# Altium footprint library 6-Connectors-2.PcbLib: 57 footprints (part 4 of 7)
Each footprint in its own frame and in the unit in brackets; x right, y up, seen from the top. Pads: shape width x height; smd on the part's side, far side on the other; paste and mask are expansions set on the pad; w line width, h text height; cw(c..) or ccw(c..) is an arc to the next point about the centre after c.
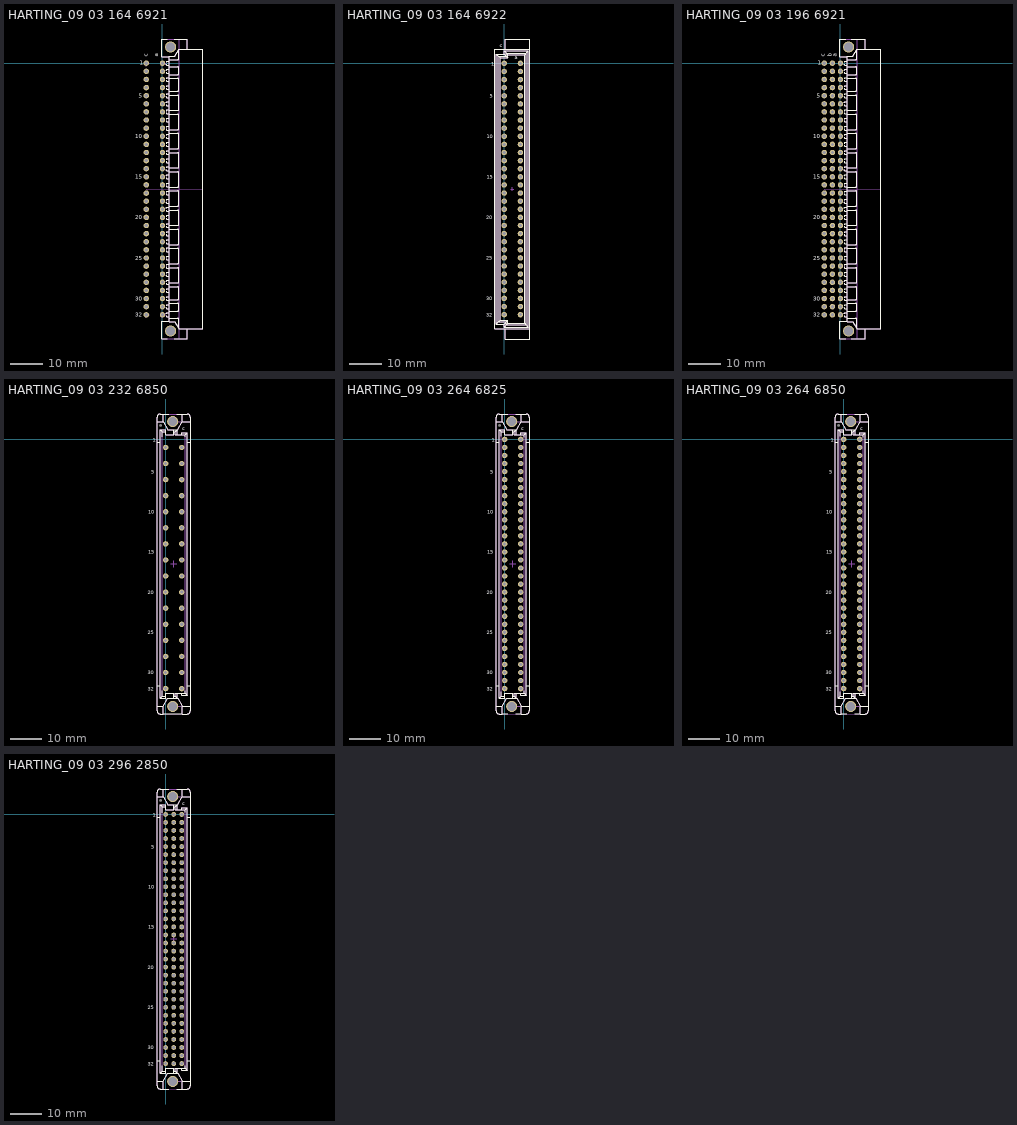
[diagram p3: the footprints below, top view; thin cyan lines are the x and y axes]

## HARTING_09 03 164 6921 [mm] "Connector; DIN 41612, Type C, Thru-Hole; Rows a+c, 64 Position; Right Angle"
height 9.35
pads (66):
  round 1.7 hole 1: a1(0,0) a2(0,-2.54) a3(0,-5.08) a4(0,-7.62) a5(0,-10.16) a6(0,-12.7) a7(0,-15.24) a8(0,-17.78) a9(0,-20.32) a10(0,-22.86) a11(0,-25.4) a12(0,-27.94) a13(0,-30.48) a14(0,-33.02) a15(0,-35.56) a16(0,-38.1) a17(0,-40.64) a18(0,-43.18) a19(0,-45.72) a20(0,-48.26) a21(0,-50.8) a22(0,-53.34) a23(0,-55.88) a24(0,-58.42) a25(0,-60.96) a26(0,-63.5) a27(0,-66.04) a28(0,-68.58) a29(0,-71.12) a30(0,-73.66) a31(0,-76.2) a32(0,-78.74) c1(-5.08,0) c2(-5.08,-2.54) c3(-5.08,-5.08) c4(-5.08,-7.62) c5(-5.08,-10.16) c6(-5.08,-12.7) c7(-5.08,-15.24) c8(-5.08,-17.78) c9(-5.08,-20.32) c10(-5.08,-22.86) c11(-5.08,-25.4) c12(-5.08,-27.94) c13(-5.08,-30.48) c14(-5.08,-33.02) c15(-5.08,-35.56) c16(-5.08,-38.1) c17(-5.08,-40.64) c18(-5.08,-43.18) c19(-5.08,-45.72) c20(-5.08,-48.26) c21(-5.08,-50.8) c22(-5.08,-53.34) c23(-5.08,-55.88) c24(-5.08,-58.42) c25(-5.08,-60.96) c26(-5.08,-63.5) c27(-5.08,-66.04) c28(-5.08,-68.58) c29(-5.08,-71.12) c30(-5.08,-73.66) c31(-5.08,-76.2) c32(-5.08,-78.74)
  round 3.5 / inner round 3.5 / far side round 5.1 hole 2.8: MTG1(2.54,5.08) MTG2(2.54,-83.82)
Top Overlay:
  drawing of 224 lines, arcs and shapes, not listed
  text "1" at -7.045,-0.55 h1.2
  text "c" at -4.58,2.04 h1.2
  text "a" at -1.325,2.09 h1.2
  text "32" at -8.57,-79.39 h1.2
  text "5" at -7.445,-10.86 h1.2
  text "10" at -8.495,-23.51 h1.2
  text "15" at -8.47,-36.11 h1.2
  text "20" at -8.57,-48.91 h1.2
  text "25" at -8.57,-61.61 h1.2
  text "30" at -8.57,-74.31 h1.2
Mechanical 8:
  lines w0.1: -5.08,-79.74 -5.08,-78.74 -4.08,-78.74 ; -5.08,-39.37 12.64,-39.37 ; -5.08,-1 -5.08,0 -4.08,0 ; 0,-79.74 0,-78.74 1,-78.74 ; 0,-1 0,0 1,0 ; 2.54,-84.82 2.54,-83.82 3.54,-83.82 ; 2.54,4.08 2.54,5.08 3.54,5.08 ; 5.3,-86.32 5.3,7.58
  text "PCB" at 5.08,-41.275 h1.2
Mechanical 14:
  drawing of 222 lines, arcs and shapes, not listed
  text "1" at -7.045,-0.55 h1.2
  text "c" at -4.58,2.04 h1.2
  text "a" at -1.325,2.09 h1.2
  text "32" at -8.57,-79.39 h1.2
  text "5" at -7.445,-10.86 h1.2
  text "10" at -8.495,-23.51 h1.2
  text "15" at -8.47,-36.11 h1.2
  text "20" at -8.57,-48.91 h1.2
  text "25" at -8.57,-61.61 h1.2
  text "30" at -8.57,-74.31 h1.2
3D body "HARTING_09 03 164 6921.stp": height 9.4, standoff -3, extent -5.38,-86.37 12.64,7.63
3D body "v160-080.stp": height 0.02, standoff -1.65, extent -5.88,-0.8 -4.28,0.8
3D body "v160-080.stp": height 0.02, standoff -1.65, extent -5.88,-5.88 -4.28,-4.28
3D body "v160-080.stp": height 0.02, standoff -1.65, extent -5.88,-3.34 -4.28,-1.74
3D body "v160-080.stp": height 0.02, standoff -1.65, extent -0.8,-0.8 0.8,0.8
3D body "v160-080.stp": height 0.02, standoff -1.65, extent -0.8,-5.88 0.8,-4.28
3D body "v160-080.stp": height 0.02, standoff -1.65, extent -0.8,-3.34 0.8,-1.74
3D body "v160-080.stp": height 0.02, standoff -1.65, extent -5.88,-8.42 -4.28,-6.82
3D body "v160-080.stp": height 0.02, standoff -1.65, extent -5.88,-13.5 -4.28,-11.9
3D body "v160-080.stp": height 0.02, standoff -1.65, extent -5.88,-10.96 -4.28,-9.36
3D body "v160-080.stp": height 0.02, standoff -1.65, extent -0.8,-8.42 0.8,-6.82
3D body "v160-080.stp": height 0.02, standoff -1.65, extent -0.8,-13.5 0.8,-11.9
3D body "v160-080.stp": height 0.02, standoff -1.65, extent -0.8,-10.96 0.8,-9.36
3D body "v160-080.stp": height 0.02, standoff -1.65, extent -0.8,-16.04 0.8,-14.44
3D body "v160-080.stp": height 0.02, standoff -1.65, extent -0.8,-21.12 0.8,-19.52
3D body "v160-080.stp": height 0.02, standoff -1.65, extent -0.8,-18.58 0.8,-16.98
3D body "v160-080.stp": height 0.02, standoff -1.65, extent -5.88,-16.04 -4.28,-14.44
3D body "v160-080.stp": height 0.02, standoff -1.65, extent -5.88,-21.12 -4.28,-19.52
3D body "v160-080.stp": height 0.02, standoff -1.65, extent -5.88,-18.58 -4.28,-16.98
3D body "v160-080.stp": height 0.02, standoff -1.65, extent -0.8,-23.66 0.8,-22.06
3D body "v160-080.stp": height 0.02, standoff -1.65, extent -0.8,-28.74 0.8,-27.14
3D body "v160-080.stp": height 0.02, standoff -1.65, extent -0.8,-26.2 0.8,-24.6
3D body "v160-080.stp": height 0.02, standoff -1.65, extent -5.88,-23.66 -4.28,-22.06
3D body "v160-080.stp": height 0.02, standoff -1.65, extent -5.88,-28.74 -4.28,-27.14
3D body "v160-080.stp": height 0.02, standoff -1.65, extent -5.88,-26.2 -4.28,-24.6
3D body "v160-080.stp": height 0.02, standoff -1.65, extent -0.8,-31.28 0.8,-29.68
3D body "v160-080.stp": height 0.02, standoff -1.65, extent -0.8,-36.36 0.8,-34.76
3D body "v160-080.stp": height 0.02, standoff -1.65, extent -0.8,-33.82 0.8,-32.22
3D body "v160-080.stp": height 0.02, standoff -1.65, extent -5.88,-31.28 -4.28,-29.68
3D body "v160-080.stp": height 0.02, standoff -1.65, extent -5.88,-36.36 -4.28,-34.76
3D body "v160-080.stp": height 0.02, standoff -1.65, extent -5.88,-33.82 -4.28,-32.22
3D body "v160-080.stp": height 0.02, standoff -1.65, extent -0.8,-38.9 0.8,-37.3
3D body "v160-080.stp": height 0.02, standoff -1.65, extent -0.8,-43.98 0.8,-42.38
3D body "v160-080.stp": height 0.02, standoff -1.65, extent -0.8,-41.44 0.8,-39.84
3D body "v160-080.stp": height 0.02, standoff -1.65, extent -5.88,-38.9 -4.28,-37.3
3D body "v160-080.stp": height 0.02, standoff -1.65, extent -5.88,-43.98 -4.28,-42.38
3D body "v160-080.stp": height 0.02, standoff -1.65, extent -5.88,-41.44 -4.28,-39.84
3D body "v160-080.stp": height 0.02, standoff -1.65, extent -0.8,-46.52 0.8,-44.92
3D body "v160-080.stp": height 0.02, standoff -1.65, extent -0.8,-51.6 0.8,-50
3D body "v160-080.stp": height 0.02, standoff -1.65, extent -0.8,-49.06 0.8,-47.46
3D body "v160-080.stp": height 0.02, standoff -1.65, extent -5.88,-46.52 -4.28,-44.92
3D body "v160-080.stp": height 0.02, standoff -1.65, extent -5.88,-51.6 -4.28,-50
3D body "v160-080.stp": height 0.02, standoff -1.65, extent -5.88,-49.06 -4.28,-47.46
3D body "v160-080.stp": height 0.02, standoff -1.65, extent -0.8,-54.14 0.8,-52.54
3D body "v160-080.stp": height 0.02, standoff -1.65, extent -0.8,-59.22 0.8,-57.62
3D body "v160-080.stp": height 0.02, standoff -1.65, extent -0.8,-56.68 0.8,-55.08
3D body "v160-080.stp": height 0.02, standoff -1.65, extent -5.88,-54.14 -4.28,-52.54
3D body "v160-080.stp": height 0.02, standoff -1.65, extent -5.88,-59.22 -4.28,-57.62
3D body "v160-080.stp": height 0.02, standoff -1.65, extent -5.88,-56.68 -4.28,-55.08
3D body "v160-080.stp": height 0.02, standoff -1.65, extent -0.8,-61.76 0.8,-60.16
3D body "v160-080.stp": height 0.02, standoff -1.65, extent -0.8,-66.84 0.8,-65.24
3D body "v160-080.stp": height 0.02, standoff -1.65, extent -0.8,-64.3 0.8,-62.7
3D body "v160-080.stp": height 0.02, standoff -1.65, extent -5.88,-61.76 -4.28,-60.16
3D body "v160-080.stp": height 0.02, standoff -1.65, extent -5.88,-66.84 -4.28,-65.24
3D body "v160-080.stp": height 0.02, standoff -1.65, extent -5.88,-64.3 -4.28,-62.7
3D body "v160-080.stp": height 0.02, standoff -1.65, extent -0.8,-69.38 0.8,-67.78
3D body "v160-080.stp": height 0.02, standoff -1.65, extent -0.8,-74.46 0.8,-72.86
3D body "v160-080.stp": height 0.02, standoff -1.65, extent -0.8,-71.92 0.8,-70.32
3D body "v160-080.stp": height 0.02, standoff -1.65, extent -5.88,-69.38 -4.28,-67.78
3D body "v160-080.stp": height 0.02, standoff -1.65, extent -5.88,-74.46 -4.28,-72.86
3D body "v160-080.stp": height 0.02, standoff -1.65, extent -5.88,-71.92 -4.28,-70.32
3D body "v160-080.stp": height 0.02, standoff -1.65, extent -0.8,-77 0.8,-75.4
3D body "v160-080.stp": height 0.02, standoff -1.65, extent -0.8,-79.54 0.8,-77.94
3D body "v160-080.stp": height 0.02, standoff -1.65, extent -5.88,-77 -4.28,-75.4
3D body "v160-080.stp": height 0.02, standoff -1.65, extent -5.88,-79.54 -4.28,-77.94

## HARTING_09 03 164 6922 [mm] "DIN 41612, Type C,  Thru-Hole; Rows a+c, 64 Position, Performance level 2, Lead 3mm, Pitch 2.54mm, Straight Male Connector"
height 13
pads (64):
  round 1.7 hole 1: a1(5.08,0) a2(5.08,-2.54) a3(5.08,-5.08) a4(5.08,-7.62) a5(5.08,-10.16) a6(5.08,-12.7) a7(5.08,-15.24) a8(5.08,-17.78) a9(5.08,-20.32) a10(5.08,-22.86) a11(5.08,-25.4) a12(5.08,-27.94) a13(5.08,-30.48) a14(5.08,-33.02) a15(5.08,-35.56) a16(5.08,-38.1) a17(5.08,-40.64) a18(5.08,-43.18) a19(5.08,-45.72) a20(5.08,-48.26) a21(5.08,-50.8) a22(5.08,-53.34) a23(5.08,-55.88) a24(5.08,-58.42) a25(5.08,-60.96) a26(5.08,-63.5) a27(5.08,-66.04) a28(5.08,-68.58) a29(5.08,-71.12) a30(5.08,-73.66) a31(5.08,-76.2) a32(5.08,-78.74) c1(0,0) c2(0,-2.54) c3(0,-5.08) c4(0,-7.62) c5(0,-10.16) c6(0,-12.7) c7(0,-15.24) c8(0,-17.78) c9(0,-20.32) c10(0,-22.86) c11(0,-25.4) c12(0,-27.94) c13(0,-30.48) c14(0,-33.02) c15(0,-35.56) c16(0,-38.1) c17(0,-40.64) c18(0,-43.18) c19(0,-45.72) c20(0,-48.26) c21(0,-50.8) c22(0,-53.34) c23(0,-55.88) c24(0,-58.42) c25(0,-60.96) c26(0,-63.5) c27(0,-66.04) c28(0,-68.58) c29(0,-71.12) c30(0,-73.66) c31(0,-76.2) c32(0,-78.74)
Top Overlay:
  lines w0.2: 0.39,-83.121 0.39,-86.37 8.04,-86.37 8.04,7.63 0.39,7.63 0.39,4.38 ; 8.04,-83.12 -2.96,-83.12 -2.96,4.38 8.04,4.38 ; -2.46,-81.67 -2.46,2.93 ; -2.46,-81.67 -0.06,-81.67 ; -2.46,-81.67 -1.81,-81.02 ; -2.46,2.93 -0.06,2.93 ; -2.46,2.93 -1.31,1.78 ; -1.81,-81.02 -1.81,2.28 0.59,2.28 0.59,3.23 6.89,3.23 6.89,-81.97 0.59,-81.97 0.59,-81.02 -1.81,-81.02 ; -1.81,-81.02 -1.31,-80.52 ; -1.31,-80.52 -1.31,1.78 ; -1.31,-80.52 1.09,-80.52 ; -1.31,1.78 1.09,1.78 ; -0.06,-82.62 -0.06,-81.67 ; -0.06,-82.62 7.54,-82.62 ; -0.06,-82.62 1.09,-81.47 ; -0.06,-81.67 1.09,-80.52 ; -0.06,2.93 -0.06,3.88 ; -0.06,2.93 1.09,1.78 ; -0.06,3.88 7.54,3.88 ; -0.06,3.88 1.09,2.73 ; 1.09,-81.47 1.09,-80.52 ; 1.09,-81.47 6.39,-81.47 ; 1.09,1.78 1.09,2.73 ; 1.09,2.73 6.39,2.73 ; 6.39,-81.47 6.39,2.73 ; 6.39,-81.47 7.54,-82.62 ; 6.39,2.73 7.54,3.88 ; 7.54,-82.62 7.54,3.88
  text "10" at -5.475,-23.46 h1.2
  text "c" at -1.445,5.06 h1.2
  text "a" at 3.249,1.235 h1.2
  text "32" at -5.675,-79.365 h1.2
  text "5" at -4.55,-10.835 h1.2
  text "30" at -5.675,-74.285 h1.2
  text "25" at -5.675,-61.585 h1.2
  text "20" at -5.675,-48.885 h1.2
  text "15" at -5.475,-36.135 h1.2
  text "1" at -4.075,-0.675 h1.2
Mechanical 8:
  drawing of 260 lines, arcs and shapes, not listed
Mechanical 14:
  lines w0.1: 0.39,-83.121 0.39,-86.37 8.04,-86.37 8.04,7.63 0.39,7.63 0.39,4.38 ; 8.04,-83.12 -2.96,-83.12 -2.96,4.38 8.04,4.38 ; -2.46,-81.67 -2.46,2.93 ; -2.46,-81.67 -0.06,-81.67 ; -2.46,-81.67 -1.81,-81.02 ; -2.46,2.93 -0.06,2.93 ; -2.46,2.93 -1.31,1.78 ; -1.81,-81.02 -1.81,2.28 0.59,2.28 0.59,3.23 6.89,3.23 6.89,-81.97 0.59,-81.97 0.59,-81.02 -1.81,-81.02 ; -1.81,-81.02 -1.31,-80.52 ; -1.31,-80.52 -1.31,1.78 ; -1.31,-80.52 1.09,-80.52 ; -1.31,1.78 1.09,1.78 ; -0.06,-82.62 -0.06,-81.67 ; -0.06,-82.62 7.54,-82.62 ; -0.06,-82.62 1.09,-81.47 ; -0.06,-81.67 1.09,-80.52 ; -0.06,2.93 -0.06,3.88 ; -0.06,2.93 1.09,1.78 ; -0.06,3.88 7.54,3.88 ; -0.06,3.88 1.09,2.73 ; 1.09,-81.47 1.09,-80.52 ; 1.09,-81.47 6.39,-81.47 ; 1.09,1.78 1.09,2.73 ; 1.09,2.73 6.39,2.73 ; 6.39,-81.47 6.39,2.73 ; 6.39,-81.47 7.54,-82.62 ; 6.39,2.73 7.54,3.88 ; 7.54,-82.62 7.54,3.88
  text "10" at -5.475,-23.46 h1.2
  text "32" at -5.675,-79.365 h1.2
  text "5" at -4.55,-10.835 h1.2
  text "30" at -5.675,-74.285 h1.2
  text "25" at -5.675,-61.585 h1.2
  text "20" at -5.675,-48.885 h1.2
  text "15" at -5.475,-36.135 h1.2
  text "1" at -4.075,-0.675 h1.2
  text "a" at 3.249,1.235 h1.2
  text "c" at -1.445,5.06 h1.2
3D body "HARTING_09 03 164 6922.stp": height 13, standoff -3, extent -2.96,-86.37 8.04,7.63

## HARTING_09 03 196 6921 [mm] "Connector; DIN 41612, Type C, Thru-Hole; Rows a+b+c, 96 Position; Right Angle"
height 11
pads (98):
  round 1.7 hole 1: a1(0,0) a2(0,-2.54) a3(0,-5.08) a4(0,-7.62) a5(0,-10.16) a6(0,-12.7) a7(0,-15.24) a8(0,-17.78) a9(0,-20.32) a10(0,-22.86) a11(0,-25.4) a12(0,-27.94) a13(0,-30.48) a14(0,-33.02) a15(0,-35.56) a16(0,-38.1) a17(0,-40.64) a18(0,-43.18) a19(0,-45.72) a20(0,-48.26) a21(0,-50.8) a22(0,-53.34) a23(0,-55.88) a24(0,-58.42) a25(0,-60.96) a26(0,-63.5) a27(0,-66.04) a28(0,-68.58) a29(0,-71.12) a30(0,-73.66) a31(0,-76.2) a32(0,-78.74) b1(-2.54,0) b2(-2.54,-2.54) b3(-2.54,-5.08) b4(-2.54,-7.62) b5(-2.54,-10.16) b6(-2.54,-12.7) b7(-2.54,-15.24) b8(-2.54,-17.78) b9(-2.54,-20.32) b10(-2.54,-22.86) b11(-2.54,-25.4) b12(-2.54,-27.94) b13(-2.54,-30.48) b14(-2.54,-33.02) b15(-2.54,-35.56) b16(-2.54,-38.1) b17(-2.54,-40.64) b18(-2.54,-43.18) b19(-2.54,-45.72) b20(-2.54,-48.26) b21(-2.54,-50.8) b22(-2.54,-53.34) b23(-2.54,-55.88) b24(-2.54,-58.42) b25(-2.54,-60.96) b26(-2.54,-63.5) b27(-2.54,-66.04) b28(-2.54,-68.58) b29(-2.54,-71.12) b30(-2.54,-73.66) b31(-2.54,-76.2) b32(-2.54,-78.74) c1(-5.08,0) c2(-5.08,-2.54) c3(-5.08,-5.08) c4(-5.08,-7.62) c5(-5.08,-10.16) c6(-5.08,-12.7) c7(-5.08,-15.24) c8(-5.08,-17.78) c9(-5.08,-20.32) c10(-5.08,-22.86) c11(-5.08,-25.4) c12(-5.08,-27.94) c13(-5.08,-30.48) c14(-5.08,-33.02) c15(-5.08,-35.56) c16(-5.08,-38.1) c17(-5.08,-40.64) c18(-5.08,-43.18) c19(-5.08,-45.72) c20(-5.08,-48.26) c21(-5.08,-50.8) c22(-5.08,-53.34) c23(-5.08,-55.88) c24(-5.08,-58.42) c25(-5.08,-60.96) c26(-5.08,-63.5) c27(-5.08,-66.04) c28(-5.08,-68.58) c29(-5.08,-71.12) c30(-5.08,-73.66) c31(-5.08,-76.2) c32(-5.08,-78.74)
  round 3.5 / inner round 3.5 / far side round 5.1 hole 2.8: MTG1(2.54,5.08) MTG2(2.54,-83.82)
Top Overlay:
  drawing of 227 lines, arcs and shapes, not listed
  text "a" at -1.175,2.05 h1.2
  text "b" at -2.75,2.08 h1.2
  text "c" at -4.9,2.025 h1.2
  text "1" at -7.045,-0.55 h1.2
  text "32" at -8.57,-79.39 h1.2
  text "5" at -7.445,-10.86 h1.2
  text "10" at -8.495,-23.51 h1.2
  text "15" at -8.47,-36.11 h1.2
  text "20" at -8.57,-48.91 h1.2
  text "25" at -8.57,-61.61 h1.2
  text "30" at -8.57,-74.31 h1.2
Mechanical 8:
  lines w0.1: -5.08,-39.37 12.64,-39.37 ; 5.3,-86.3 5.3,7.5
  text "PCB" at 5.08,-41.275 h1.2
Mechanical 14:
  drawing of 161 lines, arcs and shapes, not listed
  text "a" at 0.635,-0.635 h1.2
  text "c" at -4.445,-0.635 h1.2
  text "1" at -7.045,-0.55 h1.2
  text "32" at -8.57,-79.39 h1.2
  text "5" at -7.445,-10.86 h1.2
  text "10" at -8.495,-23.51 h1.2
  text "15" at -8.47,-36.11 h1.2
  text "20" at -8.57,-48.91 h1.2
  text "25" at -8.57,-61.61 h1.2
  text "30" at -8.57,-74.31 h1.2
  text "c" at -4.9,2.025 h1.2
  text "b" at -2.75,2.08 h1.2
  text "a" at -1.175,2.05 h1.2
3D body "v160-080.stp": height 0.02, standoff -1.65, extent -3.34,-79.54 -1.74,-77.94
3D body "v160-080.stp": height 0.02, standoff -1.65, extent -0.8,-79.54 0.8,-77.94
3D body "v160-080.stp": height 0.02, standoff -1.65, extent -5.88,-79.54 -4.28,-77.94
3D body "v160-080.stp": height 0.02, standoff -1.65, extent -3.34,-77 -1.74,-75.4
3D body "v160-080.stp": height 0.02, standoff -1.65, extent -0.8,-77 0.8,-75.4
3D body "v160-080.stp": height 0.02, standoff -1.65, extent -5.88,-77 -4.28,-75.4
3D body "v160-080.stp": height 0.02, standoff -1.65, extent -0.8,-64.3 0.8,-62.7
3D body "v160-080.stp": height 0.02, standoff -1.65, extent -0.8,-61.76 0.8,-60.16
3D body "v160-080.stp": height 0.02, standoff -1.65, extent -0.8,-69.38 0.8,-67.78
3D body "v160-080.stp": height 0.02, standoff -1.65, extent -0.8,-66.84 0.8,-65.24
3D body "v160-080.stp": height 0.02, standoff -1.65, extent -0.8,-74.46 0.8,-72.86
3D body "v160-080.stp": height 0.02, standoff -1.65, extent -0.8,-71.92 0.8,-70.32
3D body "v160-080.stp": height 0.02, standoff -1.65, extent -3.34,-64.3 -1.74,-62.7
3D body "v160-080.stp": height 0.02, standoff -1.65, extent -3.34,-61.76 -1.74,-60.16
3D body "v160-080.stp": height 0.02, standoff -1.65, extent -3.34,-69.38 -1.74,-67.78
3D body "v160-080.stp": height 0.02, standoff -1.65, extent -3.34,-66.84 -1.74,-65.24
3D body "v160-080.stp": height 0.02, standoff -1.65, extent -3.34,-74.46 -1.74,-72.86
3D body "v160-080.stp": height 0.02, standoff -1.65, extent -3.34,-71.92 -1.74,-70.32
3D body "v160-080.stp": height 0.02, standoff -1.65, extent -5.88,-64.3 -4.28,-62.7
3D body "v160-080.stp": height 0.02, standoff -1.65, extent -5.88,-61.76 -4.28,-60.16
3D body "v160-080.stp": height 0.02, standoff -1.65, extent -5.88,-69.38 -4.28,-67.78
3D body "v160-080.stp": height 0.02, standoff -1.65, extent -5.88,-66.84 -4.28,-65.24
3D body "v160-080.stp": height 0.02, standoff -1.65, extent -5.88,-74.46 -4.28,-72.86
3D body "v160-080.stp": height 0.02, standoff -1.65, extent -5.88,-71.92 -4.28,-70.32
3D body "v160-080.stp": height 0.02, standoff -1.65, extent -0.8,-49.06 0.8,-47.46
3D body "v160-080.stp": height 0.02, standoff -1.65, extent -0.8,-46.52 0.8,-44.92
3D body "v160-080.stp": height 0.02, standoff -1.65, extent -0.8,-54.14 0.8,-52.54
3D body "v160-080.stp": height 0.02, standoff -1.65, extent -0.8,-51.6 0.8,-50
3D body "v160-080.stp": height 0.02, standoff -1.65, extent -0.8,-59.22 0.8,-57.62
3D body "v160-080.stp": height 0.02, standoff -1.65, extent -0.8,-56.68 0.8,-55.08
3D body "v160-080.stp": height 0.02, standoff -1.65, extent -3.34,-49.06 -1.74,-47.46
3D body "v160-080.stp": height 0.02, standoff -1.65, extent -3.34,-46.52 -1.74,-44.92
3D body "v160-080.stp": height 0.02, standoff -1.65, extent -3.34,-54.14 -1.74,-52.54
3D body "v160-080.stp": height 0.02, standoff -1.65, extent -3.34,-51.6 -1.74,-50
3D body "v160-080.stp": height 0.02, standoff -1.65, extent -3.34,-59.22 -1.74,-57.62
3D body "v160-080.stp": height 0.02, standoff -1.65, extent -3.34,-56.68 -1.74,-55.08
3D body "v160-080.stp": height 0.02, standoff -1.65, extent -5.88,-49.06 -4.28,-47.46
3D body "v160-080.stp": height 0.02, standoff -1.65, extent -5.88,-46.52 -4.28,-44.92
3D body "v160-080.stp": height 0.02, standoff -1.65, extent -5.88,-54.14 -4.28,-52.54
3D body "v160-080.stp": height 0.02, standoff -1.65, extent -5.88,-51.6 -4.28,-50
3D body "v160-080.stp": height 0.02, standoff -1.65, extent -5.88,-59.22 -4.28,-57.62
3D body "v160-080.stp": height 0.02, standoff -1.65, extent -5.88,-56.68 -4.28,-55.08
3D body "v160-080.stp": height 0.02, standoff -1.65, extent -0.8,-33.82 0.8,-32.22
3D body "v160-080.stp": height 0.02, standoff -1.65, extent -0.8,-31.28 0.8,-29.68
3D body "v160-080.stp": height 0.02, standoff -1.65, extent -0.8,-38.9 0.8,-37.3
3D body "v160-080.stp": height 0.02, standoff -1.65, extent -0.8,-36.36 0.8,-34.76
3D body "v160-080.stp": height 0.02, standoff -1.65, extent -0.8,-43.98 0.8,-42.38
3D body "v160-080.stp": height 0.02, standoff -1.65, extent -0.8,-41.44 0.8,-39.84
3D body "v160-080.stp": height 0.02, standoff -1.65, extent -3.34,-33.82 -1.74,-32.22
3D body "v160-080.stp": height 0.02, standoff -1.65, extent -3.34,-31.28 -1.74,-29.68
3D body "v160-080.stp": height 0.02, standoff -1.65, extent -3.34,-38.9 -1.74,-37.3
3D body "v160-080.stp": height 0.02, standoff -1.65, extent -3.34,-36.36 -1.74,-34.76
3D body "v160-080.stp": height 0.02, standoff -1.65, extent -3.34,-43.98 -1.74,-42.38
3D body "v160-080.stp": height 0.02, standoff -1.65, extent -3.34,-41.44 -1.74,-39.84
3D body "v160-080.stp": height 0.02, standoff -1.65, extent -5.88,-33.82 -4.28,-32.22
3D body "v160-080.stp": height 0.02, standoff -1.65, extent -5.88,-31.28 -4.28,-29.68
3D body "v160-080.stp": height 0.02, standoff -1.65, extent -5.88,-38.9 -4.28,-37.3
3D body "v160-080.stp": height 0.02, standoff -1.65, extent -5.88,-36.36 -4.28,-34.76
3D body "v160-080.stp": height 0.02, standoff -1.65, extent -5.88,-43.98 -4.28,-42.38
3D body "v160-080.stp": height 0.02, standoff -1.65, extent -5.88,-41.44 -4.28,-39.84
3D body "v160-080.stp": height 0.02, standoff -1.65, extent -0.8,-18.58 0.8,-16.98
3D body "v160-080.stp": height 0.02, standoff -1.65, extent -0.8,-16.04 0.8,-14.44
3D body "v160-080.stp": height 0.02, standoff -1.65, extent -0.8,-23.66 0.8,-22.06
3D body "v160-080.stp": height 0.02, standoff -1.65, extent -0.8,-21.12 0.8,-19.52
3D body "v160-080.stp": height 0.02, standoff -1.65, extent -0.8,-28.74 0.8,-27.14
3D body "v160-080.stp": height 0.02, standoff -1.65, extent -0.8,-26.2 0.8,-24.6
3D body "v160-080.stp": height 0.02, standoff -1.65, extent -3.34,-18.58 -1.74,-16.98
3D body "v160-080.stp": height 0.02, standoff -1.65, extent -3.34,-16.04 -1.74,-14.44
3D body "v160-080.stp": height 0.02, standoff -1.65, extent -3.34,-23.66 -1.74,-22.06
3D body "v160-080.stp": height 0.02, standoff -1.65, extent -3.34,-21.12 -1.74,-19.52
3D body "v160-080.stp": height 0.02, standoff -1.65, extent -3.34,-28.74 -1.74,-27.14
3D body "v160-080.stp": height 0.02, standoff -1.65, extent -3.34,-26.2 -1.74,-24.6
3D body "v160-080.stp": height 0.02, standoff -1.65, extent -5.88,-18.58 -4.28,-16.98
3D body "v160-080.stp": height 0.02, standoff -1.65, extent -5.88,-16.04 -4.28,-14.44
3D body "v160-080.stp": height 0.02, standoff -1.65, extent -5.88,-23.66 -4.28,-22.06
3D body "v160-080.stp": height 0.02, standoff -1.65, extent -5.88,-21.12 -4.28,-19.52
3D body "v160-080.stp": height 0.02, standoff -1.65, extent -5.88,-28.74 -4.28,-27.14
3D body "v160-080.stp": height 0.02, standoff -1.65, extent -5.88,-26.2 -4.28,-24.6
3D body "v160-080.stp": height 0.02, standoff -1.65, extent -0.8,-3.34 0.8,-1.74
3D body "v160-080.stp": height 0.02, standoff -1.65, extent -0.8,-0.8 0.8,0.8
3D body "v160-080.stp": height 0.02, standoff -1.65, extent -0.8,-8.42 0.8,-6.82
3D body "v160-080.stp": height 0.02, standoff -1.65, extent -0.8,-5.88 0.8,-4.28
3D body "v160-080.stp": height 0.02, standoff -1.65, extent -0.8,-13.5 0.8,-11.9
3D body "v160-080.stp": height 0.02, standoff -1.65, extent -0.8,-10.96 0.8,-9.36
3D body "v160-080.stp": height 0.02, standoff -1.65, extent -3.34,-3.34 -1.74,-1.74
3D body "v160-080.stp": height 0.02, standoff -1.65, extent -3.34,-0.8 -1.74,0.8
3D body "v160-080.stp": height 0.02, standoff -1.65, extent -3.34,-8.42 -1.74,-6.82
3D body "v160-080.stp": height 0.02, standoff -1.65, extent -3.34,-5.88 -1.74,-4.28
3D body "v160-080.stp": height 0.02, standoff -1.65, extent -3.34,-13.5 -1.74,-11.9
3D body "v160-080.stp": height 0.02, standoff -1.65, extent -3.34,-10.96 -1.74,-9.36
3D body "v160-080.stp": height 0.02, standoff -1.65, extent -5.88,-3.34 -4.28,-1.74
3D body "v160-080.stp": height 0.02, standoff -1.65, extent -5.88,-0.8 -4.28,0.8
3D body "v160-080.stp": height 0.02, standoff -1.65, extent -5.88,-8.42 -4.28,-6.82
3D body "v160-080.stp": height 0.02, standoff -1.65, extent -5.88,-5.88 -4.28,-4.28
3D body "v160-080.stp": height 0.02, standoff -1.65, extent -5.88,-13.5 -4.28,-11.9
3D body "v160-080.stp": height 0.02, standoff -1.65, extent -5.88,-10.96 -4.28,-9.36
3D body "HARTING_09 03 196 6921.stp": height 9.35, standoff -3, extent -5.38,-86.37 12.64,7.63

## HARTING_09 03 232 6850 [mm] "DIN 41612, Type C,  Thru-Hole Press-in Terminations; Rows a+c, 32 Position, Performance level 2, Lead 4.5mm, Pitch 2.54mm, Straight Female Connector"
height 11.6
pads (34):
  round 1.7 hole 1: a2(0,-2.54) a4(0,-7.62) a6(0,-12.7) a8(0,-17.78) a10(0,-22.86) a12(0,-27.94) a14(0,-33.02) a16(0,-38.1) a18(0,-43.18) a20(0,-48.26) a22(0,-53.34) a24(0,-58.42) a26(0,-63.5) a28(0,-68.58) a30(0,-73.66) a32(0,-78.74) c2(5.08,-2.54) c4(5.08,-7.62) c6(5.08,-12.7) c8(5.08,-17.78) c10(5.08,-22.86) c12(5.08,-27.94) c14(5.08,-33.02) c16(5.08,-38.1) c18(5.08,-43.18) c20(5.08,-48.26) c22(5.08,-53.34) c24(5.08,-58.42) c26(5.08,-63.5) c28(5.08,-68.58) c30(5.08,-73.66) c32(5.08,-78.74)
  round 3.5 / inner round 3.5 / far side round 5.1 hole 2.8: MTG1(2.24,5.63) MTG2(2.24,-84.37)
Top Overlay:
  lines w0.2: -2.71,-84.37 -0.735,-84.37 ; -2.71,-77.87 -1.685,-77.87 ; -1.685,-0.87 -2.71,-0.87 -2.71,5.63 -0.735,5.63 ; -1.035,-79.4 -1.035,-81.195 ; -1.035,0.775 -1.035,2.455 ; 1,8.03 -0.735,8.03 ; 2.54,-81.845 2.54,-81.195 ; 2.54,3.105 2.54,2.455 ; 3.5,8.03 5.215,8.03 ; 3.665,-80.145 3.665,-81.845 3.015,-81.195 ; 3.665,1.405 3.665,3.105 3.015,2.455 ; 6.115,-79.425 6.115,-80.145 ; 6.115,0.825 6.115,1.405 ; 6.765,-77.87 7.79,-77.87 ; 6.765,-0.87 7.79,-0.87 ; 7.79,-84.37 5.215,-84.37 ; 7.79,5.63 5.215,5.63 ; -1.685,-81.845 0,-81.845 0,-81.195 ; -1.685,-81.845 -1.035,-81.195 ; -1.685,-81.845 -1.685,3.105 ; -1.685,3.105 -1.035,2.455 ; -1.685,3.105 0,3.105 0,2.455 ; -1.035,-81.195 0,-81.195 ; -1.035,2.455 0,2.455 ; -0.735,-86.77 -1.71,-86.77 cw(c-1.71,-85.77) -2.71,-85.77 -2.71,7.03 cw(c-1.71,7.03) -1.71,8.03 -0.735,8.03 ; -0.735,-86.77 5.215,-86.77 ; -0.735,-86.77 -0.735,-84.37 ; -0.735,-84.37 0.723,-81.845 3.757,-81.845 5.215,-84.37 ; -0.735,5.63 0.723,3.105 3.757,3.105 5.215,5.63 ; -0.735,5.63 -0.735,8.03 ; 0,-81.195 0,-80.145 2.54,-80.145 2.54,-81.195 ; 0,2.455 0,1.405 2.54,1.405 2.54,2.455 ; 2.54,-81.195 3.015,-81.195 ; 2.54,2.455 3.015,2.455 ; 3.015,-81.195 3.015,-80.145 5.08,-80.145 ; 3.015,2.455 3.015,1.405 5.08,1.405 ; 5.08,-80.145 5.08,-80.795 6.765,-80.795 ; 5.08,-80.145 6.115,-80.145 ; 5.08,1.405 6.115,1.405 ; 5.08,1.405 5.08,2.055 6.765,2.055 ; 5.215,-86.77 6.79,-86.77 ccw(c6.79,-85.77) 7.79,-85.77 7.79,7.03 ccw(c6.79,7.03) 6.79,8.03 5.215,8.03 ; 5.215,-86.77 5.215,-84.37 ; 5.215,5.63 5.215,8.03 ; 6.115,-80.145 6.765,-80.795 ; 6.115,1.405 6.765,2.055 ; 6.765,-80.795 6.765,2.055
  text "1" at -4.075,-0.675 h1.2
  text "15" at -5.475,-36.135 h1.2
  text "20" at -5.675,-48.885 h1.2
  text "25" at -5.675,-61.585 h1.2
  text "30" at -5.675,-74.285 h1.2
  text "5" at -4.55,-10.835 h1.2
  text "32" at -5.675,-79.365 h1.2
  text "10" at -5.475,-23.46 h1.2
  text "c" at 5.305,2.935 h1.2
  text "a" at -1.951,3.96 h1.2
Mechanical 8:
  lines w0.1: 1.54,-39.37 2.54,-39.37 ; 2.24,-84.37 4.78,-84.37 ; 2.24,5.63 4.78,5.63 ; 2.54,-40.37 2.54,-39.37 ; 2.54,-38.37 2.54,-39.37 ; 3.54,-39.37 2.54,-39.37
Mechanical 14:
  circle w0.1: c2.24,-84.37 r1.425
  circle w0.1: c2.24,5.63 r1.425
  lines w0.1: -2.71,-84.37 -0.735,-84.37 ; -2.71,5.63 -0.735,5.63 ; -0.735,-86.77 -0.735,-84.37 ; -0.735,8.03 -0.735,5.63 ; 3.665,-80.145 3.665,-81.845 ; 3.665,1.405 3.665,3.105 3.015,2.455 ; 3.757,3.105 5.215,5.63 ; 5.215,-86.77 5.215,-84.37 ; 5.215,8.03 5.215,5.63 ; 7.79,-84.37 5.215,-84.37 ; 7.79,5.63 5.215,5.63 ; -1.685,-81.845 -1.035,-81.195 ; -1.685,-81.845 0,-81.845 0,-81.195 ; -1.685,-81.845 -1.685,3.105 ; -1.685,3.105 -1.035,2.455 ; -1.685,3.105 0,3.105 0,2.455 ; -1.035,-81.195 -1.035,2.455 ; -1.035,-81.195 0,-81.195 ; -1.035,2.455 0,2.455 ; -0.735,-84.37 0.723,-81.845 2.54,-81.845 ; -0.735,5.63 0.723,3.105 2.54,3.105 2.54,2.455 ; 0,-81.195 0,-80.145 2.54,-80.145 2.54,-81.195 ; 0,2.455 0,1.405 2.54,1.405 2.54,2.455 ; 2.54,-81.845 2.54,-81.195 ; 2.54,-81.845 3.665,-81.845 ; 2.54,-81.195 3.015,-81.195 ; 2.54,2.455 3.015,2.455 ; 3.015,-81.195 3.015,-80.145 5.08,-80.145 ; 3.015,-81.195 3.665,-81.845 ; 3.015,2.455 3.015,1.405 5.08,1.405 ; 3.665,-81.845 3.757,-81.845 5.215,-84.37 ; 5.08,-80.145 6.115,-80.145 ; 5.08,-80.145 5.08,-80.795 6.765,-80.795 ; 5.08,1.405 6.115,1.405 ; 5.08,1.405 5.08,2.055 6.765,2.055 ; 6.115,-80.145 6.115,1.405 ; 6.115,-80.145 6.765,-80.795 ; 6.115,1.405 6.765,2.055 ; 6.765,-80.795 6.765,2.055 ; -2.71,-85.77 ccw(c-1.71,-85.77) -1.71,-86.77 6.79,-86.77 ccw(c6.79,-85.77) 7.79,-85.77 7.79,7.03 ccw(c6.79,7.03) 6.79,8.03 -1.71,8.03 ccw(c-1.71,7.03) -2.71,7.03 -2.71,-85.77
  text "1" at -4.075,-0.675 h1.2
  text "15" at -5.475,-36.135 h1.2
  text "20" at -5.675,-48.885 h1.2
  text "25" at -5.675,-61.585 h1.2
  text "30" at -5.675,-74.285 h1.2
  text "5" at -4.55,-10.835 h1.2
  text "32" at -5.675,-79.365 h1.2
  text "10" at -5.475,-23.46 h1.2
  text "c" at 5.305,2.935 h1.2
  text "a" at -1.951,3.96 h1.2
Drill Drawing:
  lines w0.1: -2.54,-58.42 -2.54,-81.28 7.62,-81.28 7.62,2.54 -2.54,2.54 -2.54,-20.32
  text "PRESS-FIT TECHNOLOGY diam. 1mm +0.1 -0" at -1.905,-56.515 h1
3D body "HARTING_09 03 232 6850.stp": height 11.6, standoff -4.5, extent -2.71,-86.82 7.79,8.08

## HARTING_09 03 264 6825 [mm] "DIN 41612, Type C, Thru-Hole; Rows a+c, 64 Position, Straight Female Connector"
height 11.6
pads (66):
  round 1.7 hole 1: a1(0,0) a2(0,-2.54) a3(0,-5.08) a4(0,-7.62) a5(0,-10.16) a6(0,-12.7) a7(0,-15.24) a8(0,-17.78) a9(0,-20.32) a10(0,-22.86) a11(0,-25.4) a12(0,-27.94) a13(0,-30.48) a14(0,-33.02) a15(0,-35.56) a16(0,-38.1) a17(0,-40.64) a18(0,-43.18) a19(0,-45.72) a20(0,-48.26) a21(0,-50.8) a22(0,-53.34) a23(0,-55.88) a24(0,-58.42) a25(0,-60.96) a26(0,-63.5) a27(0,-66.04) a28(0,-68.58) a29(0,-71.12) a30(0,-73.66) a31(0,-76.2) a32(0,-78.74) c1(5.08,0) c2(5.08,-2.54) c3(5.08,-5.08) c4(5.08,-7.62) c5(5.08,-10.16) c6(5.08,-12.7) c7(5.08,-15.24) c8(5.08,-17.78) c9(5.08,-20.32) c10(5.08,-22.86) c11(5.08,-25.4) c12(5.08,-27.94) c13(5.08,-30.48) c14(5.08,-33.02) c15(5.08,-35.56) c16(5.08,-38.1) c17(5.08,-40.64) c18(5.08,-43.18) c19(5.08,-45.72) c20(5.08,-48.26) c21(5.08,-50.8) c22(5.08,-53.34) c23(5.08,-55.88) c24(5.08,-58.42) c25(5.08,-60.96) c26(5.08,-63.5) c27(5.08,-66.04) c28(5.08,-68.58) c29(5.08,-71.12) c30(5.08,-73.66) c31(5.08,-76.2) c32(5.08,-78.74)
  round 3.5 / inner round 3.5 / far side round 5.1 hole 2.8: MTG1(2.24,5.63) MTG2(2.24,-84.37)
Top Overlay:
  lines w0.2: -2.71,-84.37 -0.735,-84.37 ; -2.71,-77.87 -1.685,-77.87 ; -1.685,-0.87 -2.71,-0.87 -2.71,5.63 -0.735,5.63 ; -1.035,-79.775 -1.035,-81.195 ; -1.035,1.035 -1.035,2.455 ; -0.736,-86.77 0.999,-86.77 ; 1,8.03 -0.735,8.03 ; 2.54,-81.845 2.54,-81.195 ; 2.54,3.105 2.54,2.455 ; 3.499,-86.77 5.214,-86.77 ; 3.5,8.03 5.215,8.03 ; 3.665,-80.145 3.665,-81.845 3.015,-81.195 ; 3.665,1.405 3.665,3.105 3.015,2.455 ; 6.115,-79.35 6.115,-80.145 ; 6.115,0.61 6.115,1.405 ; 6.765,-77.87 7.79,-77.87 ; 6.765,-0.87 7.79,-0.87 ; 7.79,-84.37 5.215,-84.37 ; 7.79,5.63 5.215,5.63 ; -1.685,-81.845 -1.685,3.105 ; -1.685,-81.845 -1.035,-81.195 ; -1.685,-81.845 0,-81.845 0,-81.195 ; -1.685,3.105 0,3.105 0,2.455 ; -1.685,3.105 -1.035,2.455 ; -1.035,-81.195 0,-81.195 ; -1.035,2.455 0,2.455 ; -0.735,-84.37 0.723,-81.845 3.757,-81.845 5.215,-84.37 ; -0.735,-84.37 -0.735,-86.77 -1.71,-86.77 cw(c-1.71,-85.77) -2.71,-85.77 -2.71,7.03 cw(c-1.71,7.03) -1.71,8.03 -0.735,8.03 ; -0.735,5.63 -0.735,8.03 ; -0.735,5.63 0.723,3.105 3.757,3.105 5.215,5.63 ; 0,-81.195 0,-80.145 2.54,-80.145 2.54,-81.195 ; 0,2.455 0,1.405 2.54,1.405 2.54,2.455 ; 2.54,-81.195 3.015,-81.195 ; 2.54,2.455 3.015,2.455 ; 3.015,-81.195 3.015,-80.145 5.08,-80.145 ; 3.015,2.455 3.015,1.405 5.08,1.405 ; 5.08,-80.145 6.115,-80.145 ; 5.08,-80.145 5.08,-80.795 6.765,-80.795 ; 5.08,1.405 5.08,2.055 6.765,2.055 ; 5.08,1.405 6.115,1.405 ; 5.215,-84.37 5.215,-86.77 6.79,-86.77 ccw(c6.79,-85.77) 7.79,-85.77 7.79,7.03 ccw(c6.79,7.03) 6.79,8.03 5.215,8.03 ; 5.215,5.63 5.215,8.03 ; 6.115,-80.145 6.765,-80.795 ; 6.115,1.405 6.765,2.055 ; 6.765,-80.795 6.765,2.055
  text "a" at -1.951,3.96 h1.2
  text "c" at 5.305,2.935 h1.2
  text "10" at -5.475,-23.46 h1.2
  text "32" at -5.675,-79.365 h1.2
  text "5" at -4.55,-10.835 h1.2
  text "30" at -5.675,-74.285 h1.2
  text "25" at -5.675,-61.585 h1.2
  text "20" at -5.675,-48.885 h1.2
  text "15" at -5.475,-36.135 h1.2
  text "1" at -4.075,-0.675 h1.2
Mechanical 8:
  lines w0.1: 1.54,-39.37 2.54,-39.37 ; 2.24,-84.37 4.78,-84.37 ; 2.24,5.63 4.78,5.63 ; 2.54,-40.37 2.54,-39.37 ; 2.54,-38.37 2.54,-39.37 ; 3.54,-39.37 2.54,-39.37
Mechanical 14:
  circle w0.1: c2.24,5.63 r1.425
  circle w0.1: c2.24,-84.37 r1.425
  lines w0.1: -2.71,-84.37 -0.735,-84.37 ; -2.71,5.63 -0.735,5.63 ; -0.735,-86.77 -0.735,-84.37 ; -0.735,8.03 -0.735,5.63 ; 3.665,-80.145 3.665,-81.845 ; 3.665,1.405 3.665,3.105 3.015,2.455 ; 3.757,3.105 5.215,5.63 ; 5.215,-86.77 5.215,-84.37 ; 5.215,8.03 5.215,5.63 ; 7.79,-84.37 5.215,-84.37 ; 7.79,5.63 5.215,5.63 ; -1.685,-81.845 -1.685,3.105 ; -1.685,-81.845 0,-81.845 0,-81.195 ; -1.685,-81.845 -1.035,-81.195 ; -1.685,3.105 0,3.105 0,2.455 ; -1.685,3.105 -1.035,2.455 ; -1.035,-81.195 0,-81.195 ; -1.035,-81.195 -1.035,2.455 ; -1.035,2.455 0,2.455 ; -0.735,-84.37 0.723,-81.845 2.54,-81.845 ; -0.735,5.63 0.723,3.105 2.54,3.105 2.54,2.455 ; 0,-81.195 0,-80.145 2.54,-80.145 2.54,-81.195 ; 0,2.455 0,1.405 2.54,1.405 2.54,2.455 ; 2.54,-81.845 3.665,-81.845 ; 2.54,-81.845 2.54,-81.195 ; 2.54,-81.195 3.015,-81.195 ; 2.54,2.455 3.015,2.455 ; 3.015,-81.195 3.665,-81.845 ; 3.015,-81.195 3.015,-80.145 5.08,-80.145 ; 3.015,2.455 3.015,1.405 5.08,1.405 ; 3.665,-81.845 3.757,-81.845 5.215,-84.37 ; 5.08,-80.145 5.08,-80.795 6.765,-80.795 ; 5.08,-80.145 6.115,-80.145 ; 5.08,1.405 5.08,2.055 6.765,2.055 ; 5.08,1.405 6.115,1.405 ; 6.115,-80.145 6.765,-80.795 ; 6.115,-80.145 6.115,1.405 ; 6.115,1.405 6.765,2.055 ; 6.765,-80.795 6.765,2.055 ; -2.71,-85.77 ccw(c-1.71,-85.77) -1.71,-86.77 6.79,-86.77 ccw(c6.79,-85.77) 7.79,-85.77 7.79,7.03 ccw(c6.79,7.03) 6.79,8.03 -1.71,8.03 ccw(c-1.71,7.03) -2.71,7.03 -2.71,-85.77
  text "a" at -1.951,3.96 h1.2
  text "c" at 5.305,2.935 h1.2
  text "10" at -5.475,-23.46 h1.2
  text "32" at -5.675,-79.365 h1.2
  text "5" at -4.55,-10.835 h1.2
  text "30" at -5.675,-74.285 h1.2
  text "25" at -5.675,-61.585 h1.2
  text "20" at -5.675,-48.885 h1.2
  text "15" at -5.475,-36.135 h1.2
  text "1" at -4.075,-0.675 h1.2
3D body "HARTING_09 03 264 6825.stp": height 11.6, standoff -4.5, extent -2.71,-86.82 7.79,8.08

## HARTING_09 03 264 6850 [mm] "DIN 41612, Type C,  Thru-Hole Press-in Terminations; Rows a+c, 64 Position, Straight Female Connector , Performance level 2, Lead 4.5 mm"
height 11.6
pads (66):
  round 1.7 hole 1: a1(0,0) a2(0,-2.54) a3(0,-5.08) a4(0,-7.62) a5(0,-10.16) a6(0,-12.7) a7(0,-15.24) a8(0,-17.78) a9(0,-20.32) a10(0,-22.86) a11(0,-25.4) a12(0,-27.94) a13(0,-30.48) a14(0,-33.02) a15(0,-35.56) a16(0,-38.1) a17(0,-40.64) a18(0,-43.18) a19(0,-45.72) a20(0,-48.26) a21(0,-50.8) a22(0,-53.34) a23(0,-55.88) a24(0,-58.42) a25(0,-60.96) a26(0,-63.5) a27(0,-66.04) a28(0,-68.58) a29(0,-71.12) a30(0,-73.66) a31(0,-76.2) a32(0,-78.74) c1(5.08,0) c2(5.08,-2.54) c3(5.08,-5.08) c4(5.08,-7.62) c5(5.08,-10.16) c6(5.08,-12.7) c7(5.08,-15.24) c8(5.08,-17.78) c9(5.08,-20.32) c10(5.08,-22.86) c11(5.08,-25.4) c12(5.08,-27.94) c13(5.08,-30.48) c14(5.08,-33.02) c15(5.08,-35.56) c16(5.08,-38.1) c17(5.08,-40.64) c18(5.08,-43.18) c19(5.08,-45.72) c20(5.08,-48.26) c21(5.08,-50.8) c22(5.08,-53.34) c23(5.08,-55.88) c24(5.08,-58.42) c25(5.08,-60.96) c26(5.08,-63.5) c27(5.08,-66.04) c28(5.08,-68.58) c29(5.08,-71.12) c30(5.08,-73.66) c31(5.08,-76.2) c32(5.08,-78.74)
  round 3.5 / inner round 3.5 / far side round 5.1 hole 2.8: MTG1(2.24,5.63) MTG2(2.24,-84.37)
Top Overlay:
  lines w0.2: -2.71,-84.37 -0.735,-84.37 ; -2.71,-77.87 -1.685,-77.87 ; -1.685,-0.87 -2.71,-0.87 -2.71,5.63 -0.735,5.63 ; -1.035,-79.775 -1.035,-81.195 ; -1.035,1.035 -1.035,2.455 ; -0.736,-86.77 0.999,-86.77 ; 1,8.03 -0.735,8.03 ; 2.54,-81.845 2.54,-81.195 ; 2.54,3.105 2.54,2.455 ; 3.499,-86.77 5.214,-86.77 ; 3.5,8.03 5.215,8.03 ; 3.665,-80.145 3.665,-81.845 3.015,-81.195 ; 3.665,1.405 3.665,3.105 3.015,2.455 ; 6.115,-79.35 6.115,-80.145 ; 6.115,0.61 6.115,1.405 ; 6.765,-77.87 7.79,-77.87 ; 6.765,-0.87 7.79,-0.87 ; 7.79,-84.37 5.215,-84.37 ; 7.79,5.63 5.215,5.63 ; -1.685,-81.845 0,-81.845 0,-81.195 ; -1.685,-81.845 -1.035,-81.195 ; -1.685,-81.845 -1.685,3.105 ; -1.685,3.105 -1.035,2.455 ; -1.685,3.105 0,3.105 0,2.455 ; -1.035,-81.195 0,-81.195 ; -1.035,2.455 0,2.455 ; -0.735,-84.37 -0.735,-86.77 -1.71,-86.77 cw(c-1.71,-85.77) -2.71,-85.77 -2.71,7.03 cw(c-1.71,7.03) -1.71,8.03 -0.735,8.03 ; -0.735,-84.37 0.723,-81.845 3.757,-81.845 5.215,-84.37 ; -0.735,5.63 0.723,3.105 3.757,3.105 5.215,5.63 ; -0.735,5.63 -0.735,8.03 ; 0,-81.195 0,-80.145 2.54,-80.145 2.54,-81.195 ; 0,2.455 0,1.405 2.54,1.405 2.54,2.455 ; 2.54,-81.195 3.015,-81.195 ; 2.54,2.455 3.015,2.455 ; 3.015,-81.195 3.015,-80.145 5.08,-80.145 ; 3.015,2.455 3.015,1.405 5.08,1.405 ; 5.08,-80.145 5.08,-80.795 6.765,-80.795 ; 5.08,-80.145 6.115,-80.145 ; 5.08,1.405 6.115,1.405 ; 5.08,1.405 5.08,2.055 6.765,2.055 ; 5.215,-84.37 5.215,-86.77 6.79,-86.77 ccw(c6.79,-85.77) 7.79,-85.77 7.79,7.03 ccw(c6.79,7.03) 6.79,8.03 5.215,8.03 ; 5.215,5.63 5.215,8.03 ; 6.115,-80.145 6.765,-80.795 ; 6.115,1.405 6.765,2.055 ; 6.765,-80.795 6.765,2.055
  text "1" at -4.075,-0.675 h1.2
  text "15" at -5.475,-36.135 h1.2
  text "20" at -5.675,-48.885 h1.2
  text "25" at -5.675,-61.585 h1.2
  text "30" at -5.675,-74.285 h1.2
  text "5" at -4.55,-10.835 h1.2
  text "32" at -5.675,-79.365 h1.2
  text "10" at -5.475,-23.46 h1.2
  text "c" at 5.305,2.935 h1.2
  text "a" at -1.951,3.96 h1.2
Mechanical 8:
  lines w0.1: 1.54,-39.37 2.54,-39.37 ; 2.24,-84.37 4.78,-84.37 ; 2.24,5.63 4.78,5.63 ; 2.54,-40.37 2.54,-39.37 ; 2.54,-38.37 2.54,-39.37 ; 3.54,-39.37 2.54,-39.37
Mechanical 14:
  circle w0.1: c2.24,-84.37 r1.425
  circle w0.1: c2.24,5.63 r1.425
  lines w0.1: -2.71,-84.37 -0.735,-84.37 ; -2.71,5.63 -0.735,5.63 ; -0.735,-86.77 -0.735,-84.37 ; -0.735,8.03 -0.735,5.63 ; 3.665,-80.145 3.665,-81.845 ; 3.665,1.405 3.665,3.105 3.015,2.455 ; 3.757,3.105 5.215,5.63 ; 5.215,-86.77 5.215,-84.37 ; 5.215,8.03 5.215,5.63 ; 7.79,-84.37 5.215,-84.37 ; 7.79,5.63 5.215,5.63 ; -1.685,-81.845 -1.035,-81.195 ; -1.685,-81.845 0,-81.845 0,-81.195 ; -1.685,-81.845 -1.685,3.105 ; -1.685,3.105 -1.035,2.455 ; -1.685,3.105 0,3.105 0,2.455 ; -1.035,-81.195 -1.035,2.455 ; -1.035,-81.195 0,-81.195 ; -1.035,2.455 0,2.455 ; -0.735,-84.37 0.723,-81.845 2.54,-81.845 ; -0.735,5.63 0.723,3.105 2.54,3.105 2.54,2.455 ; 0,-81.195 0,-80.145 2.54,-80.145 2.54,-81.195 ; 0,2.455 0,1.405 2.54,1.405 2.54,2.455 ; 2.54,-81.845 2.54,-81.195 ; 2.54,-81.845 3.665,-81.845 ; 2.54,-81.195 3.015,-81.195 ; 2.54,2.455 3.015,2.455 ; 3.015,-81.195 3.015,-80.145 5.08,-80.145 ; 3.015,-81.195 3.665,-81.845 ; 3.015,2.455 3.015,1.405 5.08,1.405 ; 3.665,-81.845 3.757,-81.845 5.215,-84.37 ; 5.08,-80.145 6.115,-80.145 ; 5.08,-80.145 5.08,-80.795 6.765,-80.795 ; 5.08,1.405 6.115,1.405 ; 5.08,1.405 5.08,2.055 6.765,2.055 ; 6.115,-80.145 6.115,1.405 ; 6.115,-80.145 6.765,-80.795 ; 6.115,1.405 6.765,2.055 ; 6.765,-80.795 6.765,2.055 ; -2.71,-85.77 ccw(c-1.71,-85.77) -1.71,-86.77 6.79,-86.77 ccw(c6.79,-85.77) 7.79,-85.77 7.79,7.03 ccw(c6.79,7.03) 6.79,8.03 -1.71,8.03 ccw(c-1.71,7.03) -2.71,7.03 -2.71,-85.77
  text "1" at -4.075,-0.675 h1.2
  text "15" at -5.475,-36.135 h1.2
  text "20" at -5.675,-48.885 h1.2
  text "25" at -5.675,-61.585 h1.2
  text "30" at -5.675,-74.285 h1.2
  text "5" at -4.55,-10.835 h1.2
  text "32" at -5.675,-79.365 h1.2
  text "10" at -5.475,-23.46 h1.2
  text "c" at 5.305,2.935 h1.2
  text "a" at -1.951,3.96 h1.2
Drill Drawing:
  lines w0.1: -2.54,-58.42 -2.54,-81.28 7.62,-81.28 7.62,2.54 -2.54,2.54 -2.54,-20.32
  text "PRESS-FIT TECHNOLOGY diam. 1mm +0.1 -0" at -1.905,-56.515 h1
3D body "HARTING_09 03 264 6850.stp": height 11.6, standoff -4.5, extent -2.71,-86.82 7.79,8.08

## HARTING_09 03 296 2850 [mm] "DIN 41612, Type C,  Thru-Hole Press-in Terminations; Rows a+b+c, 96 Position, Performance level 1, Lead 4.5mm, Pitch 2.54mm, Straight Female Connector"
height 11.6
pads (98):
  round 1.5 hole 1: a1(0,0) a2(0,-2.54) a3(0,-5.08) a4(0,-7.62) a5(0,-10.16) a6(0,-12.7) a7(0,-15.24) a8(0,-17.78) a9(0,-20.32) a10(0,-22.86) a11(0,-25.4) a12(0,-27.94) a13(0,-30.48) a14(0,-33.02) a15(0,-35.56) a16(0,-38.1) a17(0,-40.64) a18(0,-43.18) a19(0,-45.72) a20(0,-48.26) a21(0,-50.8) a22(0,-53.34) a23(0,-55.88) a24(0,-58.42) a25(0,-60.96) a26(0,-63.5) a27(0,-66.04) a28(0,-68.58) a29(0,-71.12) a30(0,-73.66) a31(0,-76.2) a32(0,-78.74) b1(2.54,0) b2(2.54,-2.54) b3(2.54,-5.08) b4(2.54,-7.62) b5(2.54,-10.16) b6(2.54,-12.7) b7(2.54,-15.24) b8(2.54,-17.78) b9(2.54,-20.32) b10(2.54,-22.86) b11(2.54,-25.4) b12(2.54,-27.94) b13(2.54,-30.48) b14(2.54,-33.02) b15(2.54,-35.56) b16(2.54,-38.1) b17(2.54,-40.64) b18(2.54,-43.18) b19(2.54,-45.72) b20(2.54,-48.26) b21(2.54,-50.8) b22(2.54,-53.34) b23(2.54,-55.88) b24(2.54,-58.42) b25(2.54,-60.96) b26(2.54,-63.5) b27(2.54,-66.04) b28(2.54,-68.58) b29(2.54,-71.12) b30(2.54,-73.66) b31(2.54,-76.2) b32(2.54,-78.74) c1(5.08,0) c2(5.08,-2.54) c3(5.08,-5.08) c4(5.08,-7.62) c5(5.08,-10.16) c6(5.08,-12.7) c7(5.08,-15.24) c8(5.08,-17.78) c9(5.08,-20.32) c10(5.08,-22.86) c11(5.08,-25.4) c12(5.08,-27.94) c13(5.08,-30.48) c14(5.08,-33.02) c15(5.08,-35.56) c16(5.08,-38.1) c17(5.08,-40.64) c18(5.08,-43.18) c19(5.08,-45.72) c20(5.08,-48.26) c21(5.08,-50.8) c22(5.08,-53.34) c23(5.08,-55.88) c24(5.08,-58.42) c25(5.08,-60.96) c26(5.08,-63.5) c27(5.08,-66.04) c28(5.08,-68.58) c29(5.08,-71.12) c30(5.08,-73.66) c31(5.08,-76.2) c32(5.08,-78.74)
  round 3.5 / inner round 3.5 / far side round 5.1 hole 2.8: MTG1(2.24,5.63) MTG2(2.24,-84.37)
Top Overlay:
  lines w0.2: -2.71,-84.37 -0.735,-84.37 ; -2.71,-77.87 -1.685,-77.87 ; -1.685,-0.87 -2.71,-0.87 -2.71,5.63 -0.735,5.63 ; -1.035,-79.41 -1.035,-81.195 ; -1.035,0.55 -1.035,2.455 ; 1,-86.77 -0.735,-86.77 ; 1,8.03 -0.735,8.03 ; 2.54,-81.845 2.54,-81.195 ; 2.54,3.105 2.54,2.455 ; 3.5,-86.77 5.215,-86.77 ; 3.5,8.03 5.215,8.03 ; 3.665,-80.145 3.665,-81.845 3.015,-81.195 ; 3.665,1.405 3.665,3.105 3.015,2.455 ; 6.115,-79.345 6.115,-80.145 ; 6.115,0.605 6.115,1.405 ; 6.765,-77.87 7.79,-77.87 ; 6.765,-0.87 7.79,-0.87 ; 7.79,-84.37 5.215,-84.37 ; 7.79,5.63 5.215,5.63 ; -1.685,-81.845 -1.685,3.105 ; -1.685,-81.845 -1.035,-81.195 ; -1.685,-81.845 0,-81.845 0,-81.195 ; -1.685,3.105 0,3.105 0,2.455 ; -1.685,3.105 -1.035,2.455 ; -1.035,-81.195 0,-81.195 ; -1.035,2.455 0,2.455 ; -0.735,-86.77 -0.735,-84.37 ; -0.735,-86.77 -1.71,-86.77 cw(c-1.71,-85.77) -2.71,-85.77 -2.71,7.03 cw(c-1.71,7.03) -1.71,8.03 -0.735,8.03 ; -0.735,-84.37 0.723,-81.845 3.757,-81.845 5.215,-84.37 ; -0.735,5.63 -0.735,8.03 ; -0.735,5.63 0.723,3.105 3.757,3.105 5.215,5.63 ; 0,-81.195 0,-80.145 2.54,-80.145 2.54,-81.195 ; 0,2.455 0,1.405 2.54,1.405 2.54,2.455 ; 2.54,-81.195 3.015,-81.195 ; 2.54,2.455 3.015,2.455 ; 3.015,-81.195 3.015,-80.145 5.08,-80.145 ; 3.015,2.455 3.015,1.405 5.08,1.405 ; 5.08,-80.145 6.115,-80.145 ; 5.08,-80.145 5.08,-80.795 6.765,-80.795 ; 5.08,1.405 5.08,2.055 6.765,2.055 ; 5.08,1.405 6.115,1.405 ; 5.215,-86.77 5.215,-84.37 ; 5.215,-86.77 6.79,-86.77 ccw(c6.79,-85.77) 7.79,-85.77 7.79,7.03 ccw(c6.79,7.03) 6.79,8.03 5.215,8.03 ; 5.215,5.63 5.215,8.03 ; 6.115,-80.145 6.765,-80.795 ; 6.115,1.405 6.765,2.055 ; 6.765,-80.795 6.765,2.055
  text "a" at -1.951,3.96 h1.2
  text "c" at 5.305,2.935 h1.2
  text "10" at -5.475,-23.46 h1.2
  text "32" at -5.675,-79.365 h1.2
  text "5" at -4.55,-10.835 h1.2
  text "30" at -5.675,-74.285 h1.2
  text "25" at -5.675,-61.585 h1.2
  text "20" at -5.675,-48.885 h1.2
  text "15" at -5.475,-36.135 h1.2
  text "1" at -4.075,-0.675 h1.2
Mechanical 8:
  lines w0.1: 1.54,-39.37 2.54,-39.37 ; 2.24,-84.37 4.78,-84.37 ; 2.24,5.63 4.78,5.63 ; 2.54,-40.37 2.54,-39.37 ; 2.54,-38.37 2.54,-39.37 ; 3.54,-39.37 2.54,-39.37
Mechanical 14:
  circle w0.1: c2.24,5.63 r1.425
  circle w0.1: c2.24,-84.37 r1.425
  lines w0.1: -2.71,-84.37 -0.735,-84.37 ; -2.71,5.63 -0.735,5.63 ; -0.735,-86.77 -0.735,-84.37 ; -0.735,8.03 -0.735,5.63 ; 3.665,-80.145 3.665,-81.845 ; 3.665,1.405 3.665,3.105 3.015,2.455 ; 3.757,3.105 5.215,5.63 ; 5.215,-86.77 5.215,-84.37 ; 5.215,8.03 5.215,5.63 ; 7.79,-84.37 5.215,-84.37 ; 7.79,5.63 5.215,5.63 ; -1.685,-81.845 -1.685,3.105 ; -1.685,-81.845 0,-81.845 0,-81.195 ; -1.685,-81.845 -1.035,-81.195 ; -1.685,3.105 0,3.105 0,2.455 ; -1.685,3.105 -1.035,2.455 ; -1.035,-81.195 0,-81.195 ; -1.035,-81.195 -1.035,2.455 ; -1.035,2.455 0,2.455 ; -0.735,-84.37 0.723,-81.845 2.54,-81.845 ; -0.735,5.63 0.723,3.105 2.54,3.105 2.54,2.455 ; 0,-81.195 0,-80.145 2.54,-80.145 2.54,-81.195 ; 0,2.455 0,1.405 2.54,1.405 2.54,2.455 ; 2.54,-81.845 3.665,-81.845 ; 2.54,-81.845 2.54,-81.195 ; 2.54,-81.195 3.015,-81.195 ; 2.54,2.455 3.015,2.455 ; 3.015,-81.195 3.665,-81.845 ; 3.015,-81.195 3.015,-80.145 5.08,-80.145 ; 3.015,2.455 3.015,1.405 5.08,1.405 ; 3.665,-81.845 3.757,-81.845 5.215,-84.37 ; 5.08,-80.145 5.08,-80.795 6.765,-80.795 ; 5.08,-80.145 6.115,-80.145 ; 5.08,1.405 5.08,2.055 6.765,2.055 ; 5.08,1.405 6.115,1.405 ; 6.115,-80.145 6.765,-80.795 ; 6.115,-80.145 6.115,1.405 ; 6.115,1.405 6.765,2.055 ; 6.765,-80.795 6.765,2.055 ; -2.71,-85.77 ccw(c-1.71,-85.77) -1.71,-86.77 6.79,-86.77 ccw(c6.79,-85.77) 7.79,-85.77 7.79,7.03 ccw(c6.79,7.03) 6.79,8.03 -1.71,8.03 ccw(c-1.71,7.03) -2.71,7.03 -2.71,-85.77
  text "a" at -1.951,3.96 h1.2
  text "c" at 5.305,2.935 h1.2
  text "10" at -5.475,-23.46 h1.2
  text "32" at -5.675,-79.365 h1.2
  text "5" at -4.55,-10.835 h1.2
  text "30" at -5.675,-74.285 h1.2
  text "25" at -5.675,-61.585 h1.2
  text "20" at -5.675,-48.885 h1.2
  text "15" at -5.475,-36.135 h1.2
  text "1" at -4.075,-0.675 h1.2
Drill Drawing:
  lines w0.1: -2.54,-58.42 -2.54,-81.28 7.62,-81.28 7.62,2.54 -2.54,2.54 -2.54,-20.32
  text "PRESS-FIT TECHNOLOGY diam. 1mm +0.1 -0" at -1.905,-56.515 h1
3D body "HARTING_09 03 296 2850.stp": height 11.6, standoff -4.5, extent -2.71,-86.82 7.79,8.08